# Altium footprint library Lapwing.PcbLib: 81 footprints (part 2 of 6)
Each footprint in its own frame and in the unit in brackets; x right, y up, seen from the top. Pads: shape width x height; smd on the part's side, far side on the other; paste and mask are expansions set on the pad; w line width, h text height; cw(c..) or ccw(c..) is an arc to the next point about the centre after c.
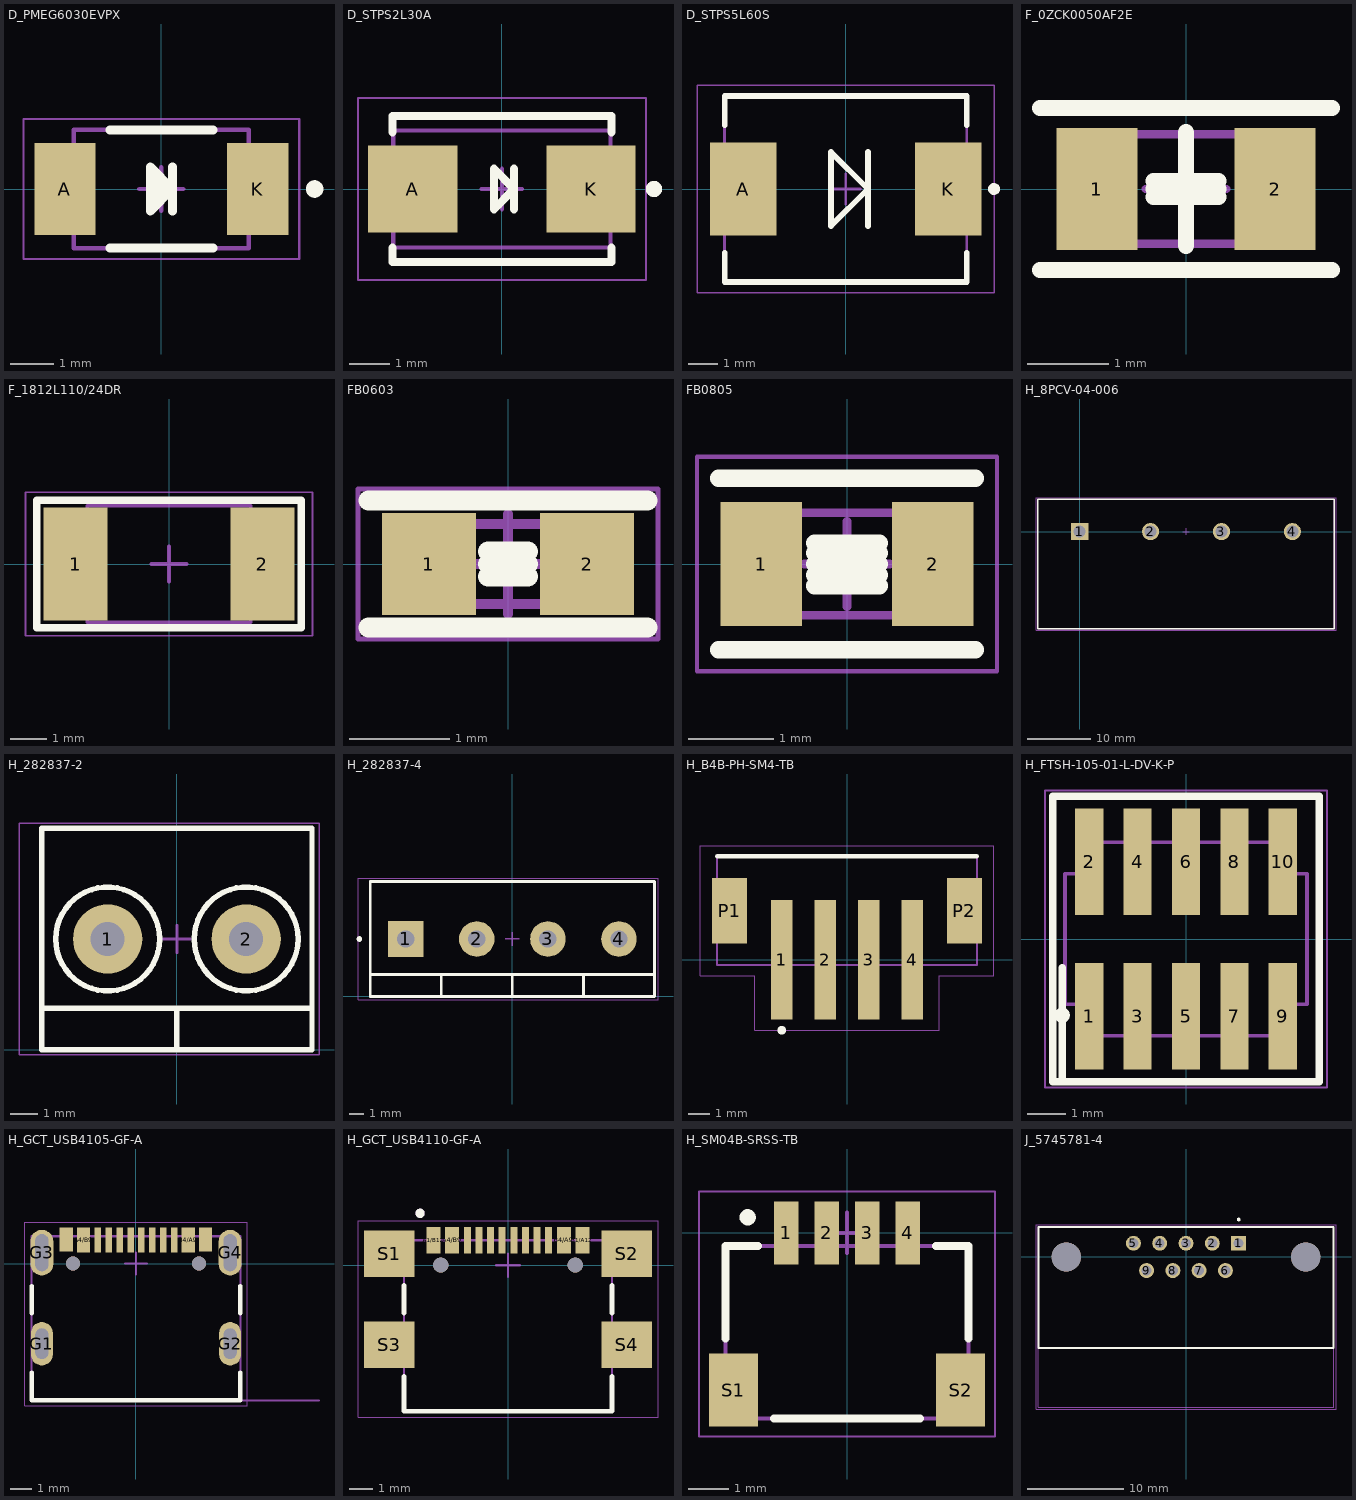
[diagram p1: the footprints below, top view; thin cyan lines are the x and y axes]

## D_PMEG6030EVPX [mm] "DIODE SOD128"
pads (2):
  rect 1.4x2.1 smd paste-2: A(-2.2,0) K(2.2,0)
Top Overlay:
  circle w0.2: c3.5,0 r0.1
  lines w0.2: -1.18,-1.35 1.18,-1.35 ; -1.18,1.35 1.18,1.35 ; -0.127,-0.381 -0.127,0.381 ; 0,-0.254 0,0.254 ; 0.127,-0.127 0.127,0.127 ; 0.254,-0.508 0.254,0.508 ; -0.254,-0.508 -0.254,0.508 0.254,0 -0.254,-0.508
Top Paste:
  region: -1.6,-0.95 -2.8,-0.95 -2.8,0.95 -1.6,0.95
  region: 2.8,-0.95 1.6,-0.95 1.6,0.95 2.8,0.95
Mechanical 13:
  lines w0.1: -2,-1.35 -2,1.35 2,1.35 2,-1.35 -2,-1.35
Mechanical 15:
  lines w0.05: -3.15,-1.6 -3.15,1.6 3.15,1.6 3.15,-1.6 -3.15,-1.6
  lines w0.1: -0.5,0 0.5,0 ; 0,-0.5 0,0.5
3D body "User Library-SOD128.step": height 1.1, standoff -0.01, extent -2.5,-1.35 2.5,1.35

## D_STPS2L30A [mm]
pads (2):
  rect 2.2x2.15 smd: A(-2.2,0) K(2.2,0)
Top Overlay:
  circle w0.2: c3.75,0 r0.1
  lines w0.2: -2.7,-1.45 -2.7,-1.8 2.7,-1.8 2.7,-1.45 ; -2.7,1.4 -2.7,1.8 2.7,1.8 2.7,1.4 ; 0.3,-0.5 0.3,0.5 ; -0.2,-0.5 -0.2,0.5 0.3,0 -0.2,-0.5
Mechanical 13:
  lines w0.1: -2.68,-1.448 -2.68,1.448 2.68,1.448 2.68,-1.448 -2.68,-1.448
Mechanical 15:
  lines w0.05: -3.55,-2.25 3.55,-2.25 3.55,2.25 -3.55,2.25 -3.55,-2.25
  lines w0.1: -0.5,0 0.5,0 ; 0,-0.5 0,0.5
3D body "SMA.step": height 3.14, standoff 0, extent -2.68,-1.448 2.68,1.448

## D_STPS5L60S [mm] "DIODE SMB"
pads (2):
  rect 2.25x3.12 smd: A(-3.455,0) K(3.455,0)
Top Overlay:
  circle w0.2: c5,0 r0.1
  lines w0.2: -4.08,-2.15 -4.08,-3.13 4.08,-3.13 4.08,-2.15 ; -4.08,2.15 -4.08,3.13 4.08,3.13 4.08,2.15 ; 0.75,-1.25 0.75,1.25 ; -0.5,-1.25 -0.5,1.25 0.75,0 -0.5,-1.25
Mechanical 13:
  lines w0.1: -4.08,-3.13 -4.08,3.13 4.08,3.13 4.08,-3.13 -4.08,-3.13
Mechanical 15:
  lines w0.05: -5,-3.5 5,-3.5 5,3.5 -5,3.5 -5,-3.5
  lines w0.1: -0.5,0 0.5,0 ; 0,-0.5 0,0.5
3D body "SMC.STEP": height 2.6, standoff 0, extent -3.97,-2.952 3.97,2.952

## F_0ZCK0050AF2E [mm] "FUSE PTC 0805"
pads (2):
  rect 1x1.5 smd: 1(-1.1,0) 2(1.1,0)
Top Overlay:
  lines w0.2: -1.8,-1 1.8,-1 ; -1.8,1 1.8,1 ; -0.4,-0.1 0.4,-0.1 ; -0.4,0 0.4,0 ; -0.4,0.1 0.4,0.1 ; 0,-0.7 0,0.7
Mechanical 13:
  lines w0.1: -1.075,-0.675 1.075,-0.675 1.075,0.675 -1.075,0.675 -1.075,-0.675
Mechanical 15:
  lines w0.1: -0.5,0 0.5,0 ; 0,-0.5 0,0.5
3D body "Part2.SLDPRT": height 0.66, standoff 0, extent -1.075,-0.675 1.075,0.675

## F_1812L110/24DR [mil] "FUSE 1812"
pads (2):
  rect 70x124 smd: 1(-102.5,0) 2(102.5,0)
Top Overlay:
  lines w7.87: -145,-70 -145,70 145,70 145,-70 -145,-70
Mechanical 13:
  lines w3.94: -89.57,-63.78 -89.57,63.78 89.57,63.78 89.57,-63.78 -89.57,-63.78
Mechanical 15:
  lines w1.97: -157.48,-78.74 157.48,-78.74 157.48,78.74 -157.48,78.74 -157.48,-78.74
  lines w3.94: -19.68,0 19.68,0 ; 0,-19.68 0,19.68
3D body "1812L110-16DR--3DModel-STEP-56544.STEP": height 49.21, standoff 0, extent -89.56,-63.78 89.57,63.78

## FB0603 [mm] "FB/IND 0603"
pads (2):
  rect 0.94x1.02 smd: 1(-0.79,0) 2(0.79,0)
Top Overlay:
  lines w0.2: -1.397,-0.635 1.397,-0.635 ; -1.397,0.635 1.397,0.635 ; -0.2,-0.127 0.2,-0.127 ; -0.2,0 0.2,0 ; -0.2,0.127 0.2,0.127
Mechanical 13:
  lines w0.1: -0.8,-0.4 0.8,-0.4 0.8,0.4 -0.8,0.4 -0.8,-0.4
Mechanical 15:
  lines w0.05: -1.5,-0.75 1.5,-0.75 1.5,0.75 -1.5,0.75 -1.5,-0.75
  lines w0.1: -0.5,0 0.5,0 ; 0,-0.5 0,0.5
3D body "FB0603.step": height 1, standoff 0, extent -0.8,-0.4 0.8,0.4

## FB0805 [mm] "FB/IND 0805"
pads (2):
  rect 0.95x1.45 smd: 1(-1,0) 2(1,0)
Top Overlay:
  lines w0.2: -1.5,-1 1.5,-1 ; -1.5,1 1.5,1 ; -0.381,-0.254 0.381,-0.254 ; -0.381,-0.127 0.381,-0.127 ; -0.381,0 0.381,0 ; -0.381,0.127 0.381,0.127 ; -0.381,0.246 0.381,0.246
Mechanical 13:
  lines w0.1: -1,-0.6 1,-0.6 1,0.6 -1,0.6 -1,-0.6
Mechanical 15:
  lines w0.05: -1.75,-1.25 1.75,-1.25 1.75,1.25 -1.75,1.25 -1.75,-1.25
  lines w0.1: -0.5,0 0.5,0 ; 0,-0.5 0,0.5
3D body "FB0805.step": height 1.05, standoff 0, extent -1,-0.625 1,0.625

## H_8PCV-04-006 [mm] "BARREL BLOCK 4WAY 0.438\""
pads (4):
  rect 2.7x2.7 hole 1.9: 1(0,0)
  round 2.7 hole 1.9: 2(11.125,0) 3(22.25,0) 4(33.375,0)
Top Overlay:
  lines w0.2: -6.604,-15.24 39.974,-15.24 39.974,5.08 -6.604,5.08 -6.604,-15.24
Mechanical 13:
  lines w0.1: -6.604,-15.24 -6.604,5.08 39.974,5.08 39.974,-15.24 -6.604,-15.24
Mechanical 15:
  lines w0.05: -6.854,-15.49 -6.854,5.33 40.224,5.33 40.224,-15.49 -6.854,-15.49
  lines w0.1: 16.187,0 17.187,0 ; 16.687,-0.5 16.687,0.5
3D body "c-8-1437657-0-r-3d.stp": height 19.56, standoff -4.7, extent -6.467,-15.24 39.837,5.08

## H_282837-2 [mil] "TERMINAL BLOCK 2WAY"
pads (2):
  round 100 hole 49: 1(-100,160) 2(100,160)
Top Overlay:
  circle w7.87: c-100,160 r75
  circle w7.87: c100,160 r75
  lines w7.87: -195,60 195,60 ; 0,0 0,60 ; -195,0 -195,320 195,320 195,0 -195,0
Mechanical 15:
  lines w1.97: -227.95,-7.32 -227.95,327.32 205.12,327.32 205.12,-7.32 -227.95,-7.32
  lines w3.94: -19.68,160 19.68,160 ; 0,140.31 0,179.69
3D body "c-282837-2-g2-3d.stp": height 403.54, standoff -127.95, extent -221.81,-2.83 201.81,320

## H_282837-4 [mm]
pads (4):
  rect 2.54x2.54 hole 1.245: 1(-7.62,4.1)
  round 2.54 hole 1.245: 2(-2.54,4.1) 3(2.54,4.1) 4(7.62,4.1)
Top Overlay:
  circle w0.2: c-10.93,4.1 r0.1
  lines w0.2: -10.16,1.56 10.16,1.56 ; -5.08,0 -5.08,1.56 ; 0,0 0,1.56 ; 5.08,0 5.08,1.56 ; -10.16,0 -10.16,8.2 10.16,8.2 10.16,0 -10.16,0
Mechanical 13:
  lines w0.1: -10.16,0 -10.16,8.2 10.16,8.2 10.16,0 -10.16,0
Mechanical 15:
  lines w0.05: -11,-0.25 10.41,-0.25 10.41,8.45 -11,8.45 -11,-0.25
  lines w0.1: -0.5,4.1 0.5,4.1 ; 0,3.6 0,4.6
3D body "c-282837-4-g2-3d.stp": height 10.25, standoff -3.25, extent -10.76,0 10.16,8.2

## H_B4B-PH-SM4-TB [mm]
pads (6):
  rect 1x5.5 smd: 1(-3,0) 2(-1,0) 3(1,0) 4(3,0)
  rect 1.6x3 smd: P1(-5.4,2.25) P2(5.4,2.25)
Top Overlay:
  circle w0.2: c-3,-3.25 r0.1
  lines w0.2: -5.975,4.75 5.975,4.75
Mechanical 13:
  lines w0.1: -5.975,-0.25 -5.975,4.75 5.975,4.75 5.975,-0.25 -5.975,-0.25
Mechanical 15:
  lines w0.05: -6.75,-0.75 -4.25,-0.75 -4.25,-3.25 4.25,-3.25 4.25,-0.75 6.75,-0.75 6.75,5.25 -6.75,5.25 -6.75,-0.75
3D body "B4B-PH-SM4-TB.STEP": height 6.6, standoff 0, extent -5.975,-2.25 5.975,4.75

## H_FTSH-105-01-L-DV-K-P [mil] "HEADER 10WAY 0.5\""
pads (10):
  rect 29x110 smd mask+2: 1(-100,-80) 2(-100,80) 3(-50,-80) 4(-50,80) 5(0,-80) 6(0,80) 7(50,-80) 8(50,80) 9(100,-80) 10(100,80)
Top Overlay:
  circle w7.87: c-127.95,-78.74 r3.94
  lines w7.87: -127.95,-147.64 -127.95,-29.53 ; -137.8,-147.64 137.8,-147.64 137.8,147.64 -137.8,147.64 -137.8,-147.64
Mechanical 13:
  lines w3.94: -125,-67.5 -125,67.5 -100,67.5 -100,100 100,100 100,67.5 125,67.5 125,-67.5 100,-67.5 100,-100 -100,-100 -100,-67.5 -125,-67.5
Mechanical 15:
  lines w1.97: -145.67,-153.54 -145.67,153.54 145.67,153.54 145.67,-153.54 -145.67,-153.54
3D body "FTSH-105-01-XXX-DV-K.stp": height 244.69, standoff 3.69, extent -125,-114.17 125,115.82

## H_GCT_USB4105-GF-A [mm]
pads (18):
  rect 0.6x1.1 smd: A1/B12(-3.2,1.1) B1/A12(3.2,1.1)
  rect 0.6x1.15 smd: A4/B9(-2.4,1.075) B4/A9(2.4,1.075)
  rect 0.3x1.15 smd: A5(-1.25,1.075) A6(-0.25,1.075) A7(0.25,1.075) A8(1.25,1.075) B5(1.75,1.075) B6(0.75,1.075) B7(-0.75,1.075) B8(-1.75,1.075)
  oval 1x2 hole 0.6 slot 1.4 at 90 deg: G1(-4.32,-3.68) G2(4.32,-3.68)
  oval 1.05x2.1 hole 0.6 slot 1.7 at 90 deg: G3(-4.32,0.5) G4(4.32,0.5)
  round 0.65 hole 0.65 unplated: ""(-2.89,0) ""(2.89,0)
Top Overlay:
  lines w0.2: -4.79,-5 -4.79,-6.28 4.79,-6.28 4.79,-5 ; -4.79,-2.28 -4.79,-1.03 ; 4.79,-2.28 4.79,-1.03
Mechanical 13:
  lines w0.1: 4.8,-6.28 8.4,-6.28 ; -4.79,-6.28 -4.79,1.25 4.79,1.25 4.79,-6.28 -4.79,-6.28
  text "PCB EDGE" at 5.4,-6.18 h0.41
Mechanical 15:
  lines w0.05: -5.1,-6.53 5.1,-6.53 5.1,1.9 -5.1,1.9 -5.1,-6.53
  lines w0.1: -0.5,0 0.5,0 ; 0,-0.5 0,0.5
3D body "USB4105-GF-A--3DModel-STEP-46669.STEP": height 3.31, standoff -0.85, extent -4.79,-6.28 4.79,1.43

## H_GCT_USB4110-GF-A [mm]
pads (18):
  rect 0.6x1.15 smd: A1/B12(-3.2,1.075) A4/B9(-2.4,1.075) B1/A12(3.2,1.075) B4/A9(2.4,1.075)
  rect 0.3x1.15 smd: A5(-1.25,1.075) A6(-0.25,1.075) A7(0.25,1.075) A8(1.25,1.075) B5(1.75,1.075) B6(0.75,1.075) B7(-0.75,1.075) B8(-1.75,1.075)
  rect 2.18x2 smd: S1(-5.11,0.5) S2(5.11,0.5) S3(-5.11,-3.43) S4(5.11,-3.43)
  round 0.65 hole 0.65 unplated: ""(-2.89,0) ""(2.89,0)
Top Overlay:
  circle w0.2: c-3.78,2.23 r0.1
  lines w0.2: -4.47,-4.79 -4.47,-6.28 4.47,-6.28 4.47,-4.79 ; -4.47,-2.07 -4.47,-0.86 ; 4.47,-2.07 4.47,-0.86
Mechanical 13:
  circle w0.2: c-3.78,2.23 r0.1
  lines w0.1: -4.47,-6.28 -4.47,1.07 4.47,1.07 4.47,-6.28 -4.47,-6.28
Mechanical 15:
  lines w0.05: -6.45,-6.53 6.45,-6.53 6.45,1.9 -6.45,1.9 -6.45,-6.53
  lines w0.1: -0.5,0 0.5,0 ; 0,-0.5 0,0.5
3D body "USB4110-GF-A--3DModel-STEP-56544.STEP": height 3.28, standoff -0.68, extent -5.65,-6.28 5.65,1.4

## H_SM04B-SRSS-TB [mm] "Header JST-SH 1.0mm"
height 2.9
pads (6):
  rect 0.6x1.55 smd: 1(-1.5,0) 2(-0.5,0) 3(0.5,0) 4(1.5,0)
  rect 1.2x1.8 smd: S1(-2.8,-3.875) S2(2.8,-3.875)
Top Overlay:
  circle w0.2: c-2.45,0.385 r0.1
  lines w0.2: -3,-2.6 -3,-0.325 -2.2,-0.325 ; -1.8,-4.575 1.8,-4.575 ; 2.2,-0.325 3,-0.325 3,-2.6
Mechanical 13:
  lines w0.1: -3,-4.575 -3,-0.325 3,-0.325 3,-4.575 -3,-4.575
Mechanical 15:
  lines w0.05: -3.65,-5.025 3.65,-5.025 3.65,1.025 -3.65,1.025 -3.65,-5.025
  lines w0.1: -0.5,0 0.5,0 ; 0,-0.5 0,0.5
3D body "SM04B-SRSS-TB.STEP": height 3.06, standoff 0.1, extent -3,-4.575 3,0.375

## J_5745781-4 [mil] "D-SUB 9WAY"
pads (11):
  rect 61.5x61.5 hole 41: 1(216,56)
  round 61.5 hole 41: 2(108,56) 3(0,56) 4(-108,56) 5(-216,56) 6(162,-56) 7(54,-56) 8(-54,-56) 9(-162,-56)
  round 120 hole 120 unplated: ""(-492,0) ""(492,0)
Top Overlay:
  circle w7.87: c216.54,153.54 r3.94
  lines w7.87: -606.5,-375 606.5,-375 606.5,123 -606.5,123 -606.5,-375
Mechanical 13:
  lines w3.94: -606.5,-375 606.5,-375 ; -606.5,-375 -606.5,123 606.5,123 606.5,-375 ; -606.5,-375 -606.5,-617 606.5,-617 606.5,-375
Mechanical 15:
  lines w1.97: -616.34,-626.84 -616.34,132.84 616.34,132.84 616.34,-626.84 -616.34,-626.84
3D body "c-5745781-4-a-3d.stp": height 494, standoff -125, extent -611,-620.01 611,125.98